# Altium footprint library Generic Footprint.PcbLib: 160 footprints (part 1 of 20)
Each footprint in its own frame and in the unit in brackets; x right, y up, seen from the top. Pads: shape width x height; smd on the part's side, far side on the other; paste and mask are expansions set on the pad; w line width, h text height; cw(c..) or ccw(c..) is an arc to the next point about the centre after c.
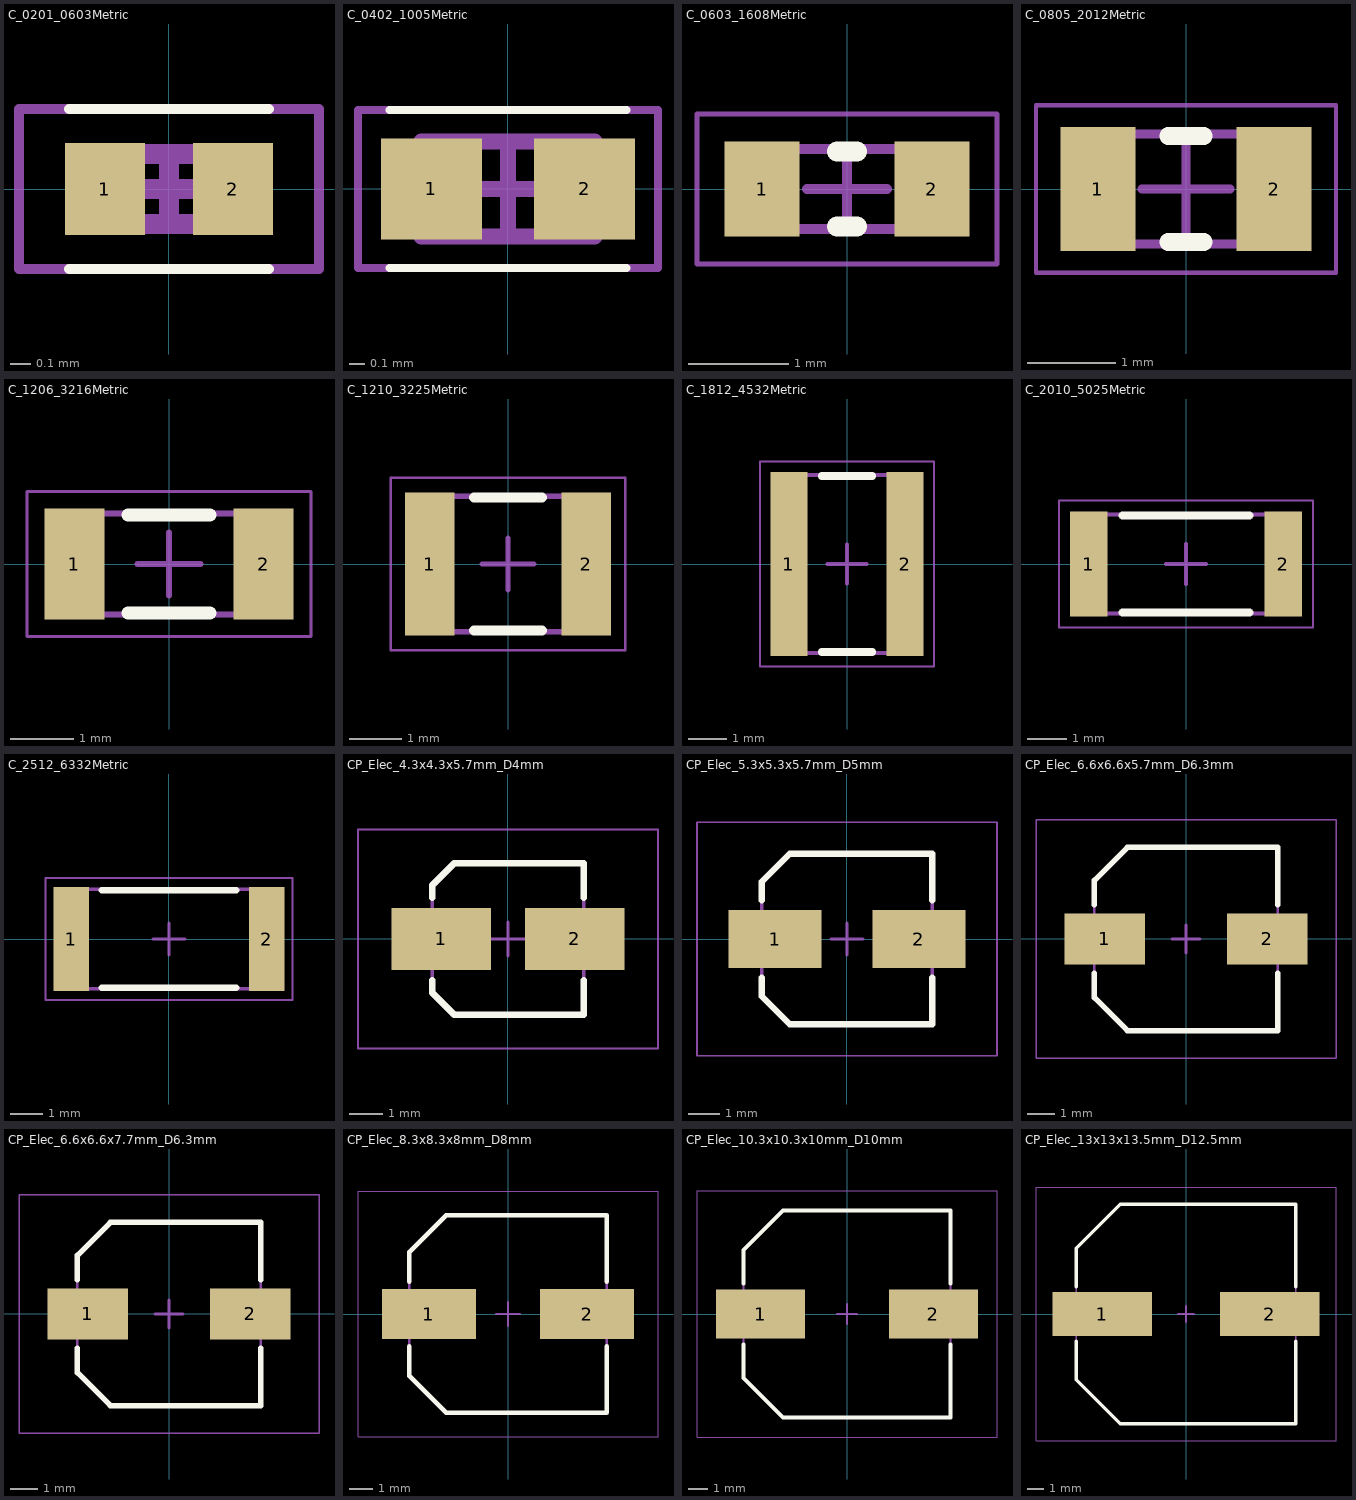
[diagram p0: the footprints below, top view; thin cyan lines are the x and y axes]

## C_0201_0603Metric [mm] "Chip Capacitor, 2-Leads, Body 0.60x0.30mm, IPC Medium Density"
height 0.23
pads (2):
  rect 0.4x0.46 smd: 1(-0.32,0) 2(0.32,0)
Top Overlay:
  lines w0.05: -0.5,-0.4 0.5,-0.4 ; -0.5,0.4 0.5,0.4
Courtyard Top:
  lines w0.05: -0.75,-0.4 -0.75,0.4 ; -0.75,-0.4 0.75,-0.4 0.75,0.4 -0.75,0.4
  lines w0.1: -0.175,0 0.175,0 ; 0,-0.175 0,0.175
Assembly Top:
  lines w0.1: -0.325,-0.175 -0.325,0.175 0.325,0.175 0.325,-0.175 -0.325,-0.175
3D body "CAPC0603X02N.step": height 0.23, standoff 0, extent -0.325,-0.175 0.325,0.175

## C_0402_1005Metric [mm]
height 0.3
pads (2):
  rect 0.64x0.64 smd: 1(-0.485,0) 2(0.485,0)
Top Overlay:
  lines w0.05: -0.75,-0.5 0.75,-0.5 ; -0.75,0.5 0.75,0.5
Courtyard Top:
  lines w0.05: -0.95,-0.5 -0.95,0.5 0.95,0.5 0.95,-0.5 -0.95,-0.5
  lines w0.1: -0.3,0 0.3,0 ; 0,-0.3 0,0.3
Assembly Top:
  lines w0.1: -0.55,-0.3 0.55,-0.3 0.55,0.3 -0.55,0.3 -0.55,-0.3
3D body "C_0402_1005Metric.step": height 0.3, standoff 0, extent -0.55,-0.3 0.55,0.3

## C_0603_1608Metric [mm]
height 0.3
pads (2):
  rect 0.75x0.95 smd: 1(-0.85,0) 2(0.85,0)
Top Overlay:
  lines w0.2: -0.1,-0.375 0.1,-0.375 ; -0.1,0.375 0.1,0.375
Courtyard Top:
  lines w0.05: -1.5,-0.75 -1.5,0.75 1.5,0.75 1.5,-0.75 -1.5,-0.75
  lines w0.1: -0.4,0 0.4,0 ; 0,-0.4 0,0.4
Assembly Top:
  lines w0.1: -0.8,-0.4 -0.8,0.4 0.8,0.4 0.8,-0.4 -0.8,-0.4
3D body "C_0603_1608Metric.step": height 0.3, standoff 0, extent -0.8,-0.4 0.8,0.4

## C_0805_2012Metric [mm]
height 0.25
pads (2):
  rect 0.85x1.4 smd: 1(-1,0) 2(1,0)
Top Overlay:
  lines w0.2: -0.2,-0.6 0.2,-0.6 ; -0.2,0.6 0.2,0.6
Courtyard Top:
  lines w0.05: -1.7,-0.95 1.7,-0.95 1.7,0.95 -1.7,0.95 -1.7,-0.95
  lines w0.1: -0.5,0 0.5,0 ; 0,-0.5 0,0.5
Assembly Top:
  lines w0.1: -1,-0.625 1,-0.625 1,0.625 -1,0.625 -1,-0.625
3D body "C_0805_2012Metric.step": height 0.25, standoff 0, extent -1,-0.625 1,0.625

## C_1206_3216Metric [mm]
height 0.55
pads (2):
  rect 0.95x1.75 smd: 1(-1.5,0) 2(1.5,0)
Top Overlay:
  lines w0.2: -0.65,-0.775 0.65,-0.775 ; -0.65,0.775 0.65,0.775
Courtyard Top:
  lines w0.05: -2.25,-1.15 -2.25,1.15 2.25,1.15 2.25,-1.15 -2.25,-1.15
  lines w0.1: -0.5,0 0.5,0 ; 0,-0.5 0,0.5
Assembly Top:
  lines w0.1: -1.55,-0.8 -1.55,0.8 1.55,0.8 1.55,-0.8 -1.55,-0.8
3D body "C_1206_3216Metric.step": height 0.55, standoff 0, extent -1.55,-0.8 1.55,0.8

## C_1210_3225Metric [mm]
height 0.55
pads (2):
  rect 0.95x2.75 smd: 1(-1.5,0) 2(1.5,0)
Top Overlay:
  lines w0.2: -0.65,-1.275 0.65,-1.275 ; -0.65,1.275 0.65,1.275
Courtyard Top:
  lines w0.05: -2.25,-1.65 2.25,-1.65 2.25,1.65 -2.25,1.65 -2.25,-1.65
  lines w0.1: -0.5,0 0.5,0 ; 0,-0.5 0,0.5
Assembly Top:
  lines w0.1: -1.55,-1.3 1.55,-1.3 1.55,1.3 -1.55,1.3 -1.55,-1.3
3D body "C_1210_3225Metric.step": height 0.55, standoff 0, extent -1.55,-1.3 1.55,1.3

## C_1812_4532Metric [mm]
height 0.55
pads (2):
  rect 0.95x4.75 smd: 1(-1.5,0) 2(1.5,0)
Top Overlay:
  lines w0.2: -0.65,-2.275 0.65,-2.275 ; -0.65,2.275 0.65,2.275
Courtyard Top:
  lines w0.05: -2.25,-2.65 -2.25,2.65 2.25,2.65 2.25,-2.65 -2.25,-2.65
  lines w0.1: -0.5,0 0.5,0 ; 0,-0.5 0,0.5
Assembly Top:
  lines w0.1: -1.55,-2.3 -1.55,2.3 1.55,2.3 1.55,-2.3 -1.55,-2.3
3D body "C_1812_4532Metric.step": height 0.55, standoff 0, extent -1.55,-2.3 1.55,2.3

## C_2010_5025Metric [mm]
height 0.55
pads (2):
  rect 0.95x2.65 smd: 1(-2.45,0) 2(2.45,0)
Top Overlay:
  lines w0.2: -1.6,-1.225 1.6,-1.225 ; -1.6,1.225 1.6,1.225
Courtyard Top:
  lines w0.05: -3.2,-1.6 -3.2,1.6 3.2,1.6 3.2,-1.6 -3.2,-1.6
  lines w0.1: -0.5,0 0.5,0 ; 0,-0.5 0,0.5
Assembly Top:
  lines w0.1: -2.5,-1.25 -2.5,1.25 2.5,1.25 2.5,-1.25 -2.5,-1.25
3D body "C_2010_5025Metric.step": height 0.55, standoff 0, extent -2.5,-1.25 2.5,1.25

## C_2512_6332Metric [mm]
height 0.55
pads (2):
  rect 1.1x3.25 smd: 1(-3.05,0) 2(3.05,0)
Top Overlay:
  lines w0.2: -2.1,-1.525 2.1,-1.525 ; -2.1,1.525 2.1,1.525
Courtyard Top:
  lines w0.05: -3.85,-1.9 3.85,-1.9 3.85,1.9 -3.85,1.9 -3.85,-1.9
  lines w0.1: -0.5,0 0.5,0 ; 0,-0.5 0,0.5
Assembly Top:
  lines w0.1: -3.175,-1.55 3.175,-1.55 3.175,1.55 -3.175,1.55 -3.175,-1.55
3D body "C_2512_6332Metric.step": height 0.55, standoff 0, extent -3.175,-1.55 3.175,1.55

## CP_Elec_4.3x4.3x5.7mm_D4mm [mm] "Aluminum Electrolytic Capacitor, Body 4.30x4.30x5.70mm, IPC Low Density"
height 5.7
pads (2):
  rect 2.95x1.85 smd: 1(-1.975,0) 2(1.975,0)
Top Overlay:
  lines w0.2: -2.25,-1.225 -2.25,-1.587 -1.587,-2.25 2.25,-2.25 2.25,-1.225 ; -2.25,1.225 -2.25,1.587 -1.587,2.25 2.25,2.25 2.25,1.225
Courtyard Top:
  lines w0.05: -4.45,-3.25 4.45,-3.25 4.45,3.25 -4.45,3.25 -4.45,-3.25
  lines w0.1: -0.5,0 0.5,0 ; 0,-0.5 0,0.5
Assembly Top:
  lines w0.1: -2.25,-1.587 -2.25,1.587 -1.587,2.25 2.25,2.25 2.25,-2.25 -1.587,-2.25 -2.25,-1.587
3D body "CP_Elec_4.3x4.3x5.7mm.step": height 5.7, standoff 0, extent -2.625,-2.25 2.625,2.25

## CP_Elec_5.3x5.3x5.7mm_D5mm [mm] "Aluminum Electrolytic Capacitor, Body 5.30x5.30x5.70mm, IPC Low Density"
height 5.7
pads (2):
  rect 2.95x1.85 smd: 1(-2.275,0) 2(2.275,0)
Top Overlay:
  lines w0.2: -2.7,-1.225 -2.7,-1.813 -1.812,-2.7 2.7,-2.7 2.7,-1.225 ; -2.7,1.225 -2.7,1.812 -1.812,2.7 2.7,2.7 2.7,1.225
Courtyard Top:
  lines w0.05: -4.75,-3.7 4.75,-3.7 4.75,3.7 -4.75,3.7 -4.75,-3.7
  lines w0.1: -0.5,0 0.5,0 ; 0,-0.5 0,0.5
Assembly Top:
  lines w0.1: -2.7,-1.813 -2.7,1.812 -1.812,2.7 2.7,2.7 2.7,-2.7 -1.812,-2.7 -2.7,-1.813
3D body "CP_Elec_5.3x5.3x5.7mm.step": height 5.7, standoff 0, extent -2.95,-2.7 2.95,2.7

## CP_Elec_6.6x6.6x5.7mm_D6.3mm [mm] "Aluminum Electrolytic Capacitor, Body 6.60x6.60x5.70mm, IPC Low Density"
height 5.7
pads (2):
  rect 2.9x1.85 smd: 1(-2.925,0) 2(2.925,0)
Top Overlay:
  lines w0.2: -3.3,-1.225 -3.3,-2.113 -2.113,-3.3 3.3,-3.3 3.3,-1.225 ; -3.3,1.225 -3.3,2.113 -2.113,3.3 3.3,3.3 3.3,1.225
Courtyard Top:
  lines w0.05: -5.4,-4.3 -5.4,4.3 5.4,4.3 5.4,-4.3 -5.4,-4.3
  lines w0.1: -0.5,0 0.5,0 ; 0,-0.5 0,0.5
Assembly Top:
  lines w0.1: -3.3,-2.113 -2.113,-3.3 3.3,-3.3 3.3,3.3 -2.113,3.3 -3.3,2.113 -3.3,-2.113
3D body "CP_Elec_6.6x6.6x5.7mm.step": height 5.7, standoff -0.6, extent -3.6,-3.3 3.6,3.3

## CP_Elec_6.6x6.6x7.7mm_D6.3mm [mm] "Aluminum Electrolytic Capacitor, Body 6.60x6.60x7.70mm, IPC Low Density"
height 7.7
pads (2):
  rect 2.9x1.85 smd: 1(-2.925,0) 2(2.925,0)
Top Overlay:
  lines w0.2: -3.3,-1.225 -3.3,-2.113 -2.113,-3.3 3.3,-3.3 3.3,-1.225 ; -3.3,1.225 -3.3,2.113 -2.113,3.3 3.3,3.3 3.3,1.225
Courtyard Top:
  lines w0.05: -5.4,-4.3 -5.4,4.3 5.4,4.3 5.4,-4.3 -5.4,-4.3
  lines w0.1: -0.5,0 0.5,0 ; 0,-0.5 0,0.5
Assembly Top:
  lines w0.1: -3.3,-2.113 -2.113,-3.3 3.3,-3.3 3.3,3.3 -2.113,3.3 -3.3,2.113 -3.3,-2.113
3D body "CP_Elec_6.6x6.6x7.7mm.step": height 7.7, standoff 0, extent -3.6,-3.3 3.6,3.3

## CP_Elec_8.3x8.3x8mm_D8mm [mm] "Aluminum Electrolytic Capacitor, Body 8.30x8.30x8.30mm, IPC Low Density"
height 8.3
pads (2):
  rect 3.95x2.1 smd: 1(-3.325,0) 2(3.325,0)
Top Overlay:
  lines w0.2: -4.15,-1.35 -4.15,-2.6 -2.6,-4.15 4.15,-4.15 4.15,-1.35 ; -4.15,1.35 -4.15,2.6 -2.6,4.15 4.15,4.15 4.15,1.35
Courtyard Top:
  lines w0.05: -6.3,-5.15 -6.3,5.15 6.3,5.15 6.3,-5.15 -6.3,-5.15
  lines w0.1: -0.5,0 0.5,0 ; 0,-0.5 0,0.5
Assembly Top:
  lines w0.1: -4.15,-2.6 -2.6,-4.15 4.15,-4.15 4.15,4.15 -2.6,4.15 -4.15,2.6 -4.15,-2.6
3D body "CP_Elec_8.3x8.3x8mm.step": height 8.3, standoff 0, extent -4.5,-4.15 4.5,4.15

## CP_Elec_10.3x10.3x10mm_D10mm [mm] "Aluminum Electrolytic Capacitor, Body 10.30x10.30x10.00mm, IPC Low Density"
height 10
pads (2):
  rect 4.5x2.5 smd: 1(-4.375,0) 2(4.375,0)
Top Overlay:
  lines w0.2: -5.25,-1.55 -5.25,-3.25 -3.25,-5.25 5.25,-5.25 5.25,-1.55 ; -5.25,1.55 -5.25,3.25 -3.25,5.25 5.25,5.25 5.25,1.55
Courtyard Top:
  lines w0.05: -7.6,-6.25 -7.6,6.25 7.6,6.25 7.6,-6.25 -7.6,-6.25
  lines w0.1: -0.5,0 0.5,0 ; 0,-0.5 0,0.5
Assembly Top:
  lines w0.1: -5.25,-3.25 -3.25,-5.25 5.25,-5.25 5.25,5.25 -3.25,5.25 -5.25,3.25 -5.25,-3.25
3D body "CP_Elec_10.3x10.3x10.step": height 10, standoff 0, extent -5.5,-5.25 5.5,5.25

## CP_Elec_13x13x13.5mm_D12.5mm [mm] "Aluminum Electrolytic Capacitor, Body 13.00x13.00x13.50mm, IPC Low Density"
height 13.5
pads (2):
  rect 5.95x2.65 smd: 1(-5,0) 2(5,0)
Top Overlay:
  lines w0.2: -6.55,-1.625 -6.55,-3.937 -3.938,-6.55 6.55,-6.55 6.55,-1.625 ; -6.55,1.625 -6.55,3.938 -3.938,6.55 6.55,6.55 6.55,1.625
Courtyard Top:
  lines w0.05: -8.95,-7.55 -8.95,7.55 8.95,7.55 8.95,-7.55 -8.95,-7.55
  lines w0.1: -0.5,0 0.5,0 ; 0,-0.5 0,0.5
Assembly Top:
  lines w0.1: -6.55,-3.937 -3.938,-6.55 6.55,-6.55 6.55,6.55 -3.938,6.55 -6.55,3.938 -6.55,-3.937
3D body "CP_Elec_13x13x13.5mm.step": height 13.5, standoff 0, extent -6.85,-6.55 6.85,6.55